# Altium footprint library BASIC.PcbLib: 244 footprints (part 15 of 16)
Each footprint in its own frame and in the unit in brackets; x right, y up, seen from the top. Pads: shape width x height; smd on the part's side, far side on the other; paste and mask are expansions set on the pad; w line width, h text height; cw(c..) or ccw(c..) is an arc to the next point about the centre after c.
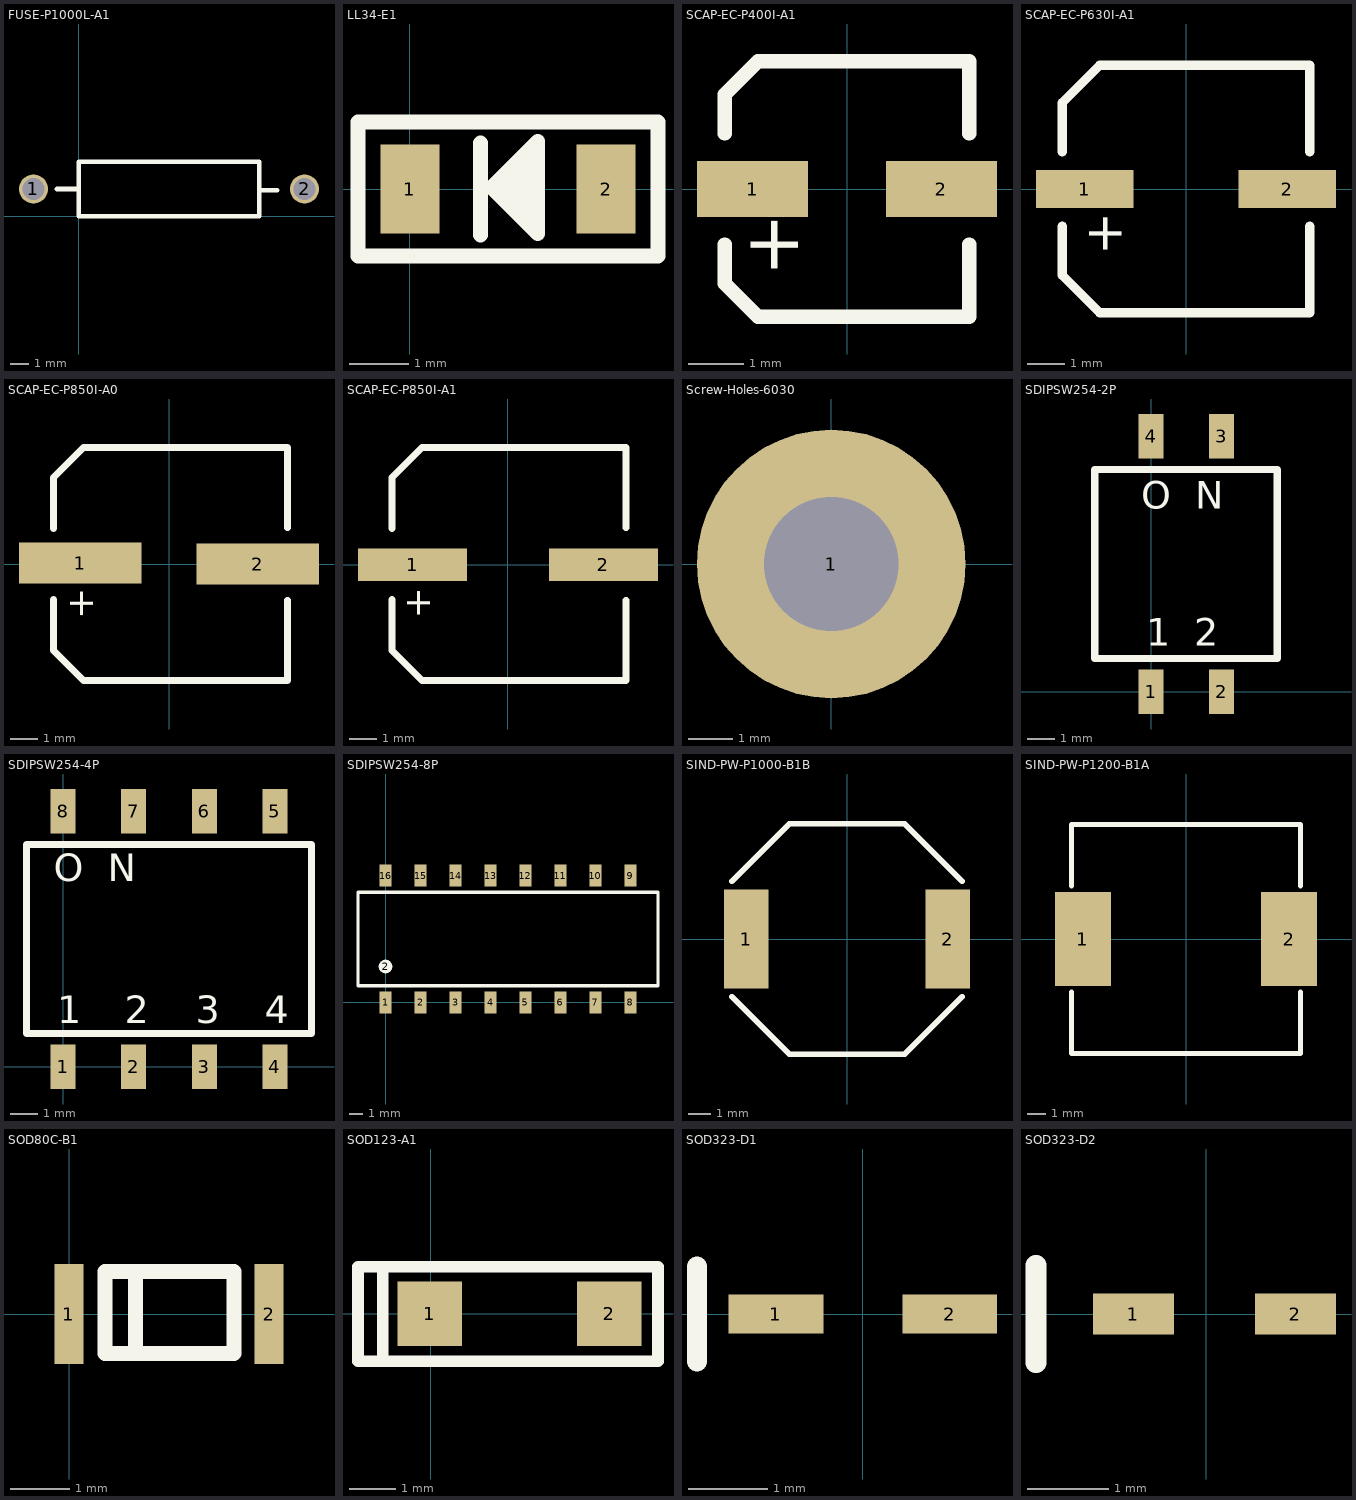
[diagram p14: the footprints below, top view; thin cyan lines are the x and y axes]

## FUSE-P1000L-A1 [mm]
pads (2):
  round 1.6 hole 1.2: 1(-2.5,1.5) 2(12.5,1.5)
Top Overlay:
  lines w0.254: -1.2,1.5 0,1.5 ; 10,1.44 11,1.44 ; 0,0 10,0 10,3 0,3 0,0
3D body "User Library-_model1.STEP": height 3.8, standoff -3, extent -2.98,-0.323 13.093,3.278

## LL34-E1 [mm]
height 1.5
pads (2):
  rect 1x1.5 smd: 1(0,0) 2(3.3,0)
Top Overlay:
  lines w0.25: 1.185,-0.775 1.185,0.775 ; 1.625,-0.075 1.625,0.175 ; 1.825,-0.3 1.825,0.375 ; 2,-0.475 2,0.55 ; -0.875,-1.125 4.175,-1.125 4.175,1.125 -0.875,1.125 -0.875,-1.125 ; 1.375,0.025 2.15,0.8 2.15,-0.75 1.375,0.025
3D body "LL34.STEP": height 1.5, standoff 0, extent -0.125,-0.75 3.375,0.75

## SCAP-EC-P400I-A1 [mm]
height 5
pads (2):
  rect 2x1 smd: 1(-1.7,0) 2(1.7,0)
Top Overlay:
  lines w0.254: -2.2,-1 -2.2,-1.7 -1.6,-2.3 2.2,-2.3 2.2,-1 ; -2.2,1 -2.2,1.7 -1.6,2.3 2.2,2.3 2.2,1
  text "+" at -0.875,-1.575 h1

## SCAP-EC-P630I-A1 [mm]
height 5.3
pads (2):
  rect 2.6x1 smd: 1(-2.7,0) 2(2.7,0)
Top Overlay:
  lines w0.254: -3.3,-1 -3.3,-2.3 -2.3,-3.3 3.3,-3.3 3.3,-1 ; -3.3,1 -3.3,2.3 -2.3,3.3 3.3,3.3 3.3,1
  text "+" at -1.72,-1.77 h1
3D body "User Library-SMD Polymer Aluminum Electrolytic Capacitors C6 82uF 6,3V.STEP": height 5.9, standoff -0.05, extent -3.68,-3.29 3.62,3.31

## SCAP-EC-P850I-A0 [mm]
pads (2):
  rect 4.5x1.5 smd: 1(-3.265,0.03) 2(3.235,0)
Top Overlay:
  lines w0.254: -4.25,-1.3 -4.25,-3.175 -3.15,-4.275 4.325,-4.275 4.325,-1.33 ; -4.25,1.3 -4.25,3.175 -3.15,4.275 4.325,4.275 4.325,1.33
  text "+" at -2.795,-2.02 h1
3D body "User Library-PXF Series_H80.STEP": height 7.71, standoff 0, extent -4.6,-4.15 4.6,4.15

## SCAP-EC-P850I-A1 [mm]
pads (2):
  rect 4x1.2 smd: 1(-3.499,-0.006) 2(3.501,-0.006)
Top Overlay:
  lines w0.254: -4.249,-1.281 -4.249,-3.156 -3.149,-4.256 4.326,-4.256 4.326,-1.311 ; -4.249,1.319 -4.249,3.194 -3.149,4.294 4.326,4.294 4.326,1.349
  text "+" at -2.845,-1.995 h1
3D body "User Library-PXF Series_H80.STEP": height 7.71, standoff 0, extent -4.599,-4.131 4.601,4.169

## Screw-Holes-6030 [mm]
pads (1):
  round 6 hole 3 mask+0.102: 1(0,0)
Top Solder:
  region: -2.51,-1.662 -1.662,-2.51 -0.778,-1.344 -1.344,-0.778
  region: -1.662,2.51 -2.51,1.662 -1.344,0.778 -0.778,1.344
  region: 2.51,1.662 1.662,2.51 0.778,1.344 1.344,0.778
  region: 1.662,-2.51 2.51,-1.662 1.344,-0.778 0.778,-1.344
  region: 3.7,-2.2
  region: 3.4,-2.3
  region: -0.6,-2.95 0.6,-2.95 0.4,-1.5 -0.4,-1.5
  region: 2.95,-0.6 2.95,0.6 1.5,0.4 1.5,-0.4
  region: 0.6,2.95 -0.6,2.95 -0.4,1.5 0.4,1.5
  region: -2.95,0.6 -2.95,-0.6 -1.5,-0.4 -1.5,0.4
Bottom Solder:
  region: -2.51,-1.662 -1.662,-2.51 -0.778,-1.344 -1.344,-0.778
  region: -1.662,2.51 -2.51,1.662 -1.344,0.778 -0.778,1.344
  region: 2.51,1.662 1.662,2.51 0.778,1.344 1.344,0.778
  region: 3.7,-2.2
  region: 3.4,-2.3
  region: -2.95,0.6 -2.95,-0.6 -1.5,-0.4 -1.5,0.4
  region: -0.6,-2.95 0.6,-2.95 0.4,-1.5 -0.4,-1.5
  region: 2.95,-0.6 2.95,0.6 1.5,0.4 1.5,-0.4
  region: 0.6,2.95 -0.6,2.95 -0.4,1.5 0.4,1.5
  region: 1.662,-2.51 2.51,-1.662 1.344,-0.778 0.778,-1.344

## SDIPSW254-2P [mm]
pads (4):
  rect 0.9x1.6 smd: 1(0.001,0.001) 2(2.541,0.001) 3(2.541,9.201) 4(0.001,9.201)
Top Overlay:
  lines w0.254: -2.031,1.201 -2.031,8.001 4.541,8.001 4.541,1.201 -2.031,1.201
  text "1  2" at -0.176,1.657 h1
  text "O  N" at -0.359,6.595 h1
3D body "User Library-053001_smt_dip_sw_2pos.STEP": height 6.05, standoff 0, extent -2.18,-0.492 4.72,9.788

## SDIPSW254-4P [mm]
pads (8):
  rect 0.9x1.6 smd: 1(-0.001,0) 2(2.539,0) 3(5.079,0) 4(7.619,0) 5(7.619,9.2) 6(5.079,9.2) 7(2.539,9.2) 8(-0.001,9.2)
Top Overlay:
  lines w0.254: -1.328,1.2 -1.328,8 8.946,8 8.946,1.2 -1.328,1.2
  text "4" at 7.263,1.57 h1
  text "3" at 4.773,1.57 h1
  text "2" at 2.222,1.57 h1
  text "1" at -0.207,1.57 h1
  text "O  N" at -0.342,6.679 h1
3D body "User Library-DIP_Switch_SMD_4.STEP": height 3.01, standoff 0.1, extent -1.193,0.006 8.817,9.306

## SDIPSW254-8P [mm]
pads (17):
  rect 0.9x1.6 smd: 1(0,0) 2(2.54,0) 3(5.08,0) 4(7.62,0) 5(10.16,0) 6(12.7,0) 7(15.24,0) 8(17.78,0) 9(17.78,9.2) 10(15.24,9.2) 11(12.7,9.2) 12(10.16,9.2) 13(7.62,9.2) 14(5.08,9.2) 15(2.54,9.2) 16(0,9.2)
  round 1 on Top Overlay: 2(0,2.6)
Top Overlay:
  lines w0.254: -2,1.2 19.779,1.2 19.779,8 -2,8 -2,1.2
3D body "User Library-smt_dip_sw_8pos.STEP": height 6.05, standoff 0, extent -2.125,-0.648 19.975,9.632

## SIND-PW-P1000-B1B [mm]
height 3.7
pads (2):
  rect 2x4.4 smd: 1(-4.5,0) 2(4.5,0)
Top Overlay:
  lines w0.25: -5.15,-2.575 -2.575,-5.15 2.575,-5.15 5.15,-2.575 ; -5.15,2.575 -2.575,5.15 2.575,5.15 5.15,2.575
3D body "sru1028-470y.stp": height 2.6, standoff -0.2, extent -4.91,-4.99 5.09,5.01

## SIND-PW-P1200-B1A [mm]
pads (2):
  rect 3x5 smd: 1(-5.5,0) 2(5.5,0)
Top Overlay:
  lines w0.254: -6.1,-2.83 -6.1,-6.1 6.1,-6.1 6.1,-2.83 ; -6.1,2.83 -6.1,6.1 6.1,6.1 6.1,2.83
3D body "SW3dPS-MSS1260.STEP": height 6.2, standoff 0.06, extent -6.15,-6.15 6.15,6.15

## SOD80C-B1 [mm]
pads (2):
  rect 0.5x1.7 smd: 1(0,0) 2(3.4,0)
Top Overlay:
  lines w0.254: 1.13,-0.635 1.13,0.723 ; 0.611,-0.673 0.611,0.726 2.805,0.726 2.805,-0.673 0.611,-0.673
3D body "User Library-SOD80C-1.STEP": height 1.6, standoff 0, extent -0.136,-0.796 3.564,0.804

## SOD123-A1 [mm]
pads (2):
  rect 1.4x1.4 smd: 1(-0.02,-0.005) 2(3.879,-0.005)
Top Overlay:
  lines w0.254: -1.582,1.016 -1.582,-1.038 -1.042,-1.038 ; -1.582,1.021 -1.023,1.021 ; -1.042,-1.038 -1.042,1.021 4.942,1.021 4.942,-1.038 -1.042,-1.038
3D body "SW3DPS-SOD123-DEFAULT.STEP": height 1.27, standoff 0, extent 0.082,-0.78 3.782,0.82

## SOD323-D1 [mm]
pads (2):
  rect 1.2x0.5 smd: 1(-1.1,0) 2(1.1,0)
Top Overlay:
  lines w0.254: -2.1,-0.6 -2.1,0.6
3D body "User Library-SOD323F-1.STEP": height 1, standoff 0, extent -1.25,-0.675 1.25,0.675

## SOD323-D2 [mm]
pads (2):
  rect 1x0.5 smd: 1(-0.9,0) 2(1.1,0)
Top Overlay:
  lines w0.254: -2.1,-0.6 -2.1,0.6
3D body "User Library-SOD323F-1.STEP": height 1, standoff 0, extent -1.25,-0.675 1.25,0.675